# Altium footprint library myLib.PcbLib: 58 footprints (part 1 of 4)
Each footprint in its own frame and in the unit in brackets; x right, y up, seen from the top. Pads: shape width x height; smd on the part's side, far side on the other; paste and mask are expansions set on the pad; w line width, h text height; cw(c..) or ccw(c..) is an arc to the next point about the centre after c.
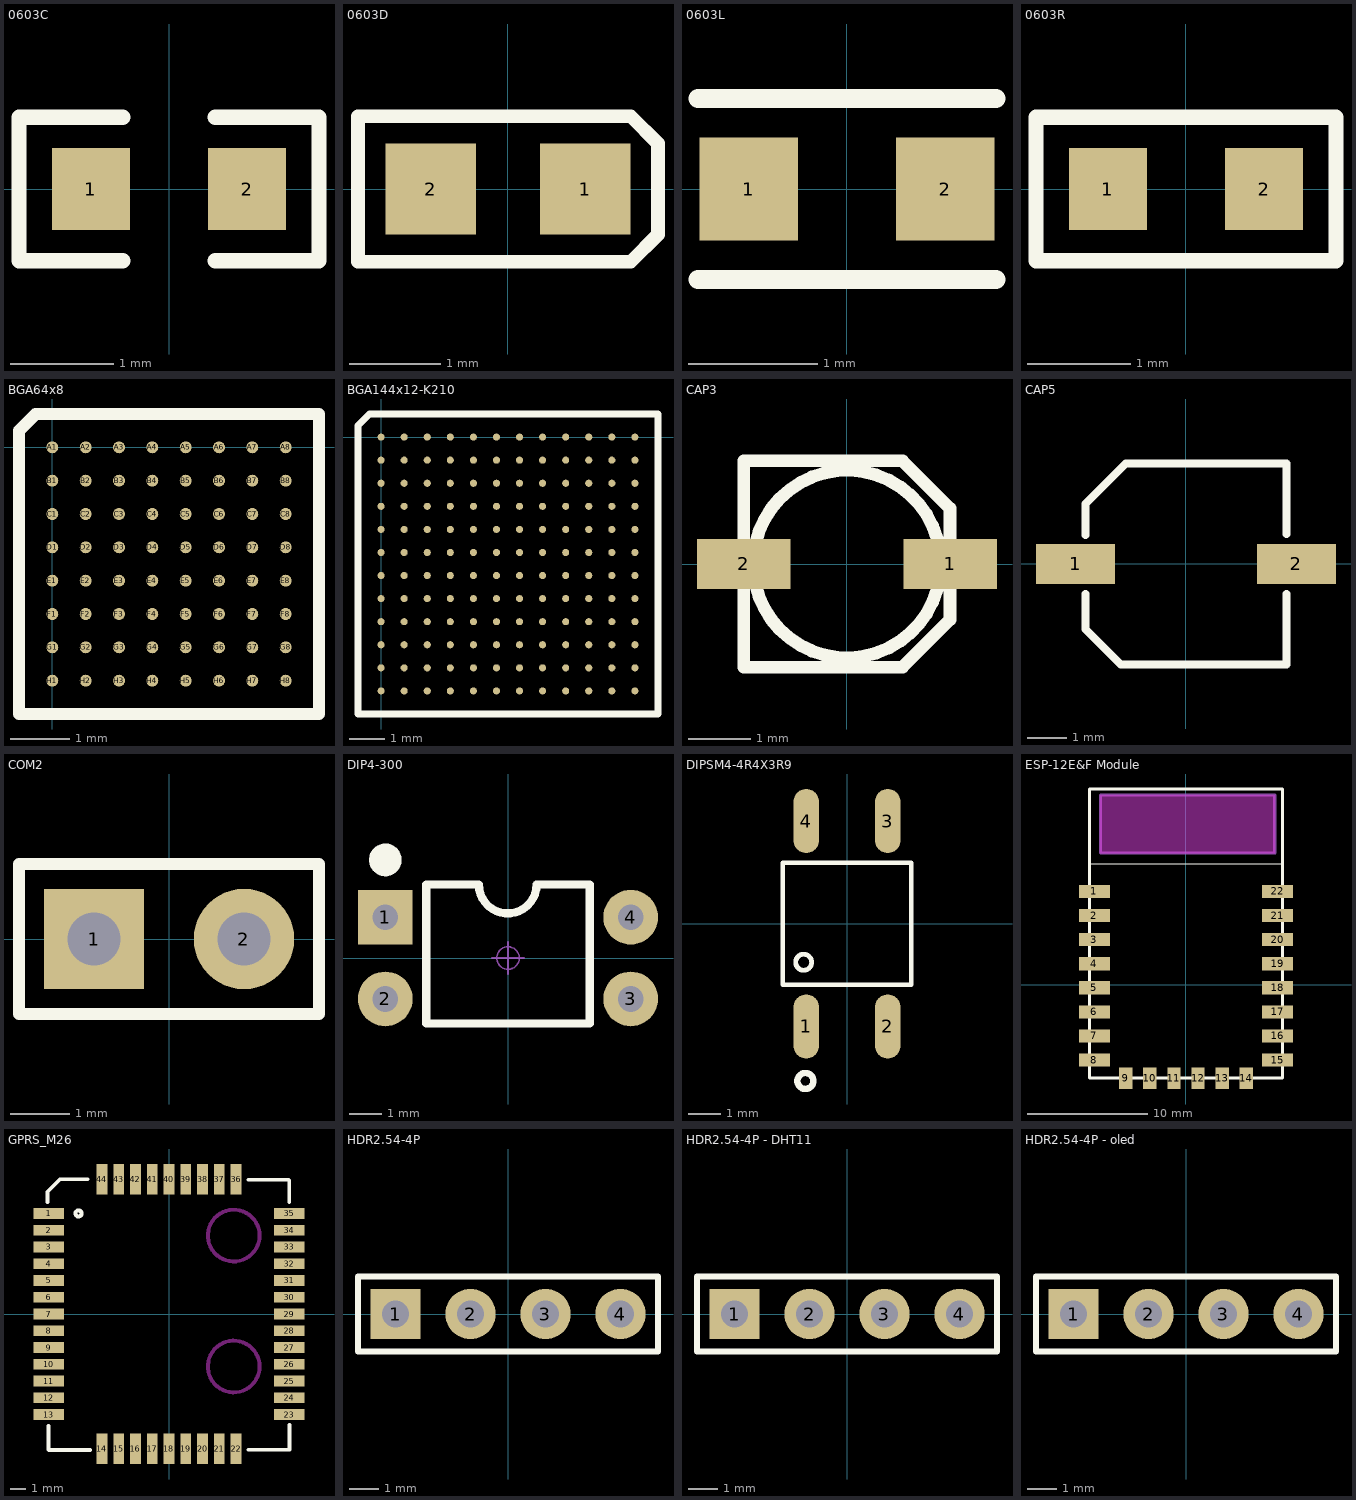
[diagram p0: the footprints below, top view; thin cyan lines are the x and y axes]

## 0603C [mm]
pads (2):
  rect 0.76x0.8 smd: 1(-0.76,0) 2(0.76,0)
Top Overlay:
  lines w0.15: -0.45,-0.7 -1.46,-0.7 -1.46,0.7 -0.45,0.7 ; 0.45,-0.7 1.46,-0.7 1.46,0.7 0.45,0.7
3D body "Capacitors_0603 (1608).STEP": height 0.85, standoff 0, extent -0.8,-0.4 0.801,0.4

## 0603D [mm]
pads (2):
  rect 1x1 smd: 1(0.85,0) 2(-0.85,0)
Top Overlay:
  lines w0.15: -1.65,-0.8 -1.65,0.8 1.35,0.8 1.65,0.5 1.65,-0.5 1.35,-0.8 -1.65,-0.8
3D body "ALSRobot-LED0603(R).STEP": height 0.6, standoff 0, extent -0.81,-0.4 0.81,0.4

## 0603L [mm]
pads (2):
  rect 0.76x0.8 smd: 1(-0.76,0) 2(0.76,0)
Top Overlay:
  lines w0.15: -1.15,-0.7 1.15,-0.7 ; -1.15,0.7 1.15,0.7

## 0603R [mm]
pads (2):
  rect 0.76x0.8 smd: 1(-0.76,0) 2(0.76,0)
Top Overlay:
  lines w0.15: -1.46,-0.7 -1.46,0.7 1.46,0.7 1.46,-0.7 -1.46,-0.7
3D body "RES-0603.STEP": height 0.56, standoff 0, extent -0.85,-0.4 0.85,0.4

## BGA64x8 [mm]
pads (64):
  round 0.2 smd: A1(0,0) A2(0.56,0) A3(1.12,0) A4(1.68,0) A5(2.24,0) A6(2.8,0) A7(3.36,0) A8(3.92,0) B1(0,-0.56) B2(0.56,-0.56) B3(1.12,-0.56) B4(1.68,-0.56) B5(2.24,-0.56) B6(2.8,-0.56) B7(3.36,-0.56) B8(3.92,-0.56) C1(0,-1.12) C2(0.56,-1.12) C3(1.12,-1.12) C4(1.68,-1.12) C5(2.24,-1.12) C6(2.8,-1.12) C7(3.36,-1.12) C8(3.92,-1.12) D1(0,-1.68) D2(0.56,-1.68) D3(1.12,-1.68) D4(1.68,-1.68) D5(2.24,-1.68) D6(2.8,-1.68) D7(3.36,-1.68) D8(3.92,-1.68) E1(0,-2.24) E2(0.56,-2.24) E3(1.12,-2.24) E4(1.68,-2.24) E5(2.24,-2.24) E6(2.8,-2.24) E7(3.36,-2.24) E8(3.92,-2.24) F1(0,-2.8) F2(0.56,-2.8) F3(1.12,-2.8) F4(1.68,-2.8) F5(2.24,-2.8) F6(2.8,-2.8) F7(3.36,-2.8) F8(3.92,-2.8) G1(0,-3.36) G2(0.56,-3.36) G3(1.12,-3.36) G4(1.68,-3.36) G5(2.24,-3.36) G6(2.8,-3.36) G7(3.36,-3.36) G8(3.92,-3.36) H1(0,-3.92) H2(0.56,-3.92) H3(1.12,-3.92) H4(1.68,-3.92) H5(2.24,-3.92) H6(2.8,-3.92) H7(3.36,-3.92) H8(3.92,-3.92)
Top Overlay:
  lines w0.2: -0.56,-4.48 -0.56,0.28 -0.28,0.56 4.48,0.56 4.48,-4.48 -0.56,-4.48

## BGA144x12-K210 [mm] "MCU k210"
pads (144):
  round 0.2 smd: A1(0,0) A2(0.65,0) A3(1.3,0) A4(1.95,0) A5(2.6,0) A6(3.25,0) A7(3.9,0) A8(4.55,0) A9(5.2,0) A10(5.85,0) A11(6.5,0) A12(7.15,0) B1(0,-0.65) B2(0.65,-0.65) B3(1.3,-0.65) B4(1.95,-0.65) B5(2.6,-0.65) B6(3.25,-0.65) B7(3.9,-0.65) B8(4.55,-0.65) B9(5.2,-0.65) B10(5.85,-0.65) B11(6.5,-0.65) B12(7.15,-0.65) C1(0,-1.3) C2(0.65,-1.3) C3(1.3,-1.3) C4(1.95,-1.3) C5(2.6,-1.3) C6(3.25,-1.3) C7(3.9,-1.3) C8(4.55,-1.3) C9(5.2,-1.3) C10(5.85,-1.3) C11(6.5,-1.3) C12(7.15,-1.3) D1(0,-1.95) D2(0.65,-1.95) D3(1.3,-1.95) D4(1.95,-1.95) D5(2.6,-1.95) D6(3.25,-1.95) D7(3.9,-1.95) D8(4.55,-1.95) D9(5.2,-1.95) D10(5.85,-1.95) D11(6.5,-1.95) D12(7.15,-1.95) E1(0,-2.6) E2(0.65,-2.6) E3(1.3,-2.6) E4(1.95,-2.6) E5(2.6,-2.6) E6(3.25,-2.6) E7(3.9,-2.6) E8(4.55,-2.6) E9(5.2,-2.6) E10(5.85,-2.6) E11(6.5,-2.6) E12(7.15,-2.6) F1(0,-3.25) F2(0.65,-3.25) F3(1.3,-3.25) F4(1.95,-3.25) F5(2.6,-3.25) F6(3.25,-3.25) F7(3.9,-3.25) F8(4.55,-3.25) F9(5.2,-3.25) F10(5.85,-3.25) F11(6.5,-3.25) F12(7.15,-3.25) G1(0,-3.9) G2(0.65,-3.9) G3(1.3,-3.9) G4(1.95,-3.9) G5(2.6,-3.9) G6(3.25,-3.9) G7(3.9,-3.9) G8(4.55,-3.9) G9(5.2,-3.9) G10(5.85,-3.9) G11(6.5,-3.9) G12(7.15,-3.9) H1(0,-4.55) H2(0.65,-4.55) H3(1.3,-4.55) H4(1.95,-4.55) H5(2.6,-4.55) H6(3.25,-4.55) H7(3.9,-4.55) H8(4.55,-4.55) H9(5.2,-4.55) H10(5.85,-4.55) H11(6.5,-4.55) H12(7.15,-4.55) J1(0,-5.2) J2(0.65,-5.2) J3(1.3,-5.2) J4(1.95,-5.2) J5(2.6,-5.2) J6(3.25,-5.2) J7(3.9,-5.2) J8(4.55,-5.2) J9(5.2,-5.2) J10(5.85,-5.2) J11(6.5,-5.2) J12(7.15,-5.2) K1(0,-5.85) K2(0.65,-5.85) K3(1.3,-5.85) K4(1.95,-5.85) K5(2.6,-5.85) K6(3.25,-5.85) K7(3.9,-5.85) K8(4.55,-5.85) K9(5.2,-5.85) K10(5.85,-5.85) K11(6.5,-5.85) K12(7.15,-5.85) L1(0,-6.5) L2(0.65,-6.5) L3(1.3,-6.5) L4(1.95,-6.5) L5(2.6,-6.5) L6(3.25,-6.5) L7(3.9,-6.5) L8(4.55,-6.5) L9(5.2,-6.5) L10(5.85,-6.5) L11(6.5,-6.5) L12(7.15,-6.5) M1(0,-7.15) M2(0.65,-7.15) M3(1.3,-7.15) M4(1.95,-7.15) M5(2.6,-7.15) M6(3.25,-7.15) M7(3.9,-7.15) M8(4.55,-7.15) M9(5.2,-7.15) M10(5.85,-7.15) M11(6.5,-7.15) M12(7.15,-7.15)
Top Overlay:
  lines w0.2: -0.65,-7.8 7.8,-7.8 7.8,0.65 -0.325,0.65 -0.65,0.325 -0.65,-7.8

## CAP3 [mm] "直径3mm（蒜米工坊）"
height 5.4
pads (2):
  rect 1.5x0.8 smd: 1(1.651,0) 2(-1.65,0)
Top Overlay:
  circle w0.203: c0,0 r1.5
  lines w0.203: -1.65,-1.65 0.89,-1.65 1.65,-0.89 1.65,0.89 0.89,1.65 -1.65,1.65 -1.65,-1.65
3D body "CM A(3X5.4).STEP": height 5.4, standoff -0.01, extent -1.9,-1.65 1.9,1.65

## CAP5 [mm] "直径5mm（蒜米工坊）"
pads (2):
  rect 2x1 smd: 1(-2.794,0) 2(2.794,0)
Top Overlay:
  lines w0.2: -2.54,-0.762 -2.54,-1.651 -1.651,-2.54 2.54,-2.54 2.54,-0.762 ; -2.54,0.73 -2.54,1.524 -1.524,2.54 2.54,2.54 2.54,0.762
3D body "SL-B.STEP": height 5.2, standoff 0, extent -2.274,-2.15 2.326,2.15

## COM2 [mm] "排针，2脚"
pads (2):
  rect 1.7x1.7 hole 0.9: 1(-1.27,0)
  round 1.7 hole 0.9: 2(1.27,0)
Top Overlay:
  lines w0.2: -2.54,-1.27 2.54,-1.27 2.54,1.27 -2.54,1.27 -2.54,-1.27

## DIP4-300 [mm] "4.6*7.6*3.8(长宽高）"
pads (4):
  rect 1.7x1.7 hole 0.8: 1(-3.81,1.27)
  round 1.7 hole 0.8: 2(-3.81,-1.27) 3(3.81,-1.27) 4(3.81,1.27)
Top Overlay:
  circle w0.508: c-3.81,3.048 r0.254
  lines w0.254: -2.54,-2.032 -2.54,2.286 -0.907,2.286 ccw(c-0.009,2.286) 0.889,2.286 2.54,2.286 2.54,-2.032 -2.54,-2.032
Mechanical 15:
  circle w0.05: c0,0 r0.35
  lines w0.05: -0.5,0 0.5,0 ; 0,-0.5 0,0.5
3D body "DIP4-300.STEP": height 4.5, standoff -3.29, extent -3.935,-2.29 3.935,2.29

## DIPSM4-4R4X3R9 [mm]
pads (4):
  oval 0.8x2 smd: 1(-1.27,-3.2) 2(1.27,-3.2) 3(1.27,3.2) 4(-1.27,3.2)
Top Overlay:
  circle w0.2: c-1.295,-4.9 r0.25
  circle w0.15: c-1.35,-1.2 r0.25
  lines w0.15: -2,-1.9 -2,1.9 2,1.9 2,-1.9 -2,-1.9

## ESP-12E&F Module [mm]
pads (22):
  rect 2.6x1.1 smd: 1(-7.6,7.75) 2(-7.6,5.75) 3(-7.6,3.75) 4(-7.6,1.75) 5(-7.6,-0.25) 6(-7.6,-2.25) 7(-7.6,-4.25) 8(-7.6,-6.25) 15(7.6,-6.25) 16(7.6,-4.25) 17(7.6,-2.25) 18(7.6,-0.25) 19(7.6,1.75) 20(7.6,3.75) 21(7.6,5.75) 22(7.6,7.75)
  rect 1.1x1.8 smd: 9(-5,-7.75) 10(-3,-7.75) 11(-1,-7.75) 12(1,-7.75) 13(3,-7.75) 14(5,-7.75)
Top Overlay:
  lines w0.1: -8,10.05 8,10.05
  lines w0.254: -8,-7.75 -8,16.25 8,16.25 8,-7.75 -8,-7.75
Keep-Out Layer:
  board cut-out: -7.112,15.748 7.366,15.748 7.366,10.922 -7.112,10.922
Mechanical 13:
  lines w0.254: 7.366,10.922 -7.112,10.922 -7.112,15.748 7.366,15.748 ; 7.366,10.922 7.366,10.922 ; 7.366,10.922 7.366,15.748 ; 7.366,15.748 7.366,15.748
3D body: height 0.4, standoff -0.4, extent 0,-0.127 0,-0.127
3D body "User Library-ESP8266-12E.STEP": height 3.1, standoff 0.1, extent -8,-7.745 8,16.635

## GPRS_M26 [mm]
pads (44):
  rect 2x0.7 smd: 1(-7.9,6.6) 2(-7.9,5.5) 3(-7.9,4.4) 4(-7.9,3.3) 5(-7.9,2.2) 6(-7.9,1.1) 7(-7.9,0) 8(-7.9,-1.1) 9(-7.9,-2.2) 10(-7.9,-3.3) 11(-7.9,-4.4) 12(-7.9,-5.5) 13(-7.9,-6.6) 23(7.9,-6.6) 24(7.9,-5.5) 25(7.9,-4.4) 26(7.9,-3.3) 27(7.9,-2.2) 28(7.9,-1.1) 29(7.9,0) 30(7.9,1.1) 31(7.9,2.2) 32(7.9,3.3) 33(7.9,4.4) 34(7.9,5.5) 35(7.9,6.6)
  rect 0.7x2 smd: 14(-4.4,-8.85) 15(-3.3,-8.85) 16(-2.2,-8.85) 17(-1.1,-8.85) 18(0,-8.85) 19(1.1,-8.85) 20(2.2,-8.85) 21(3.3,-8.85) 22(4.4,-8.85) 36(4.4,8.85) 37(3.3,8.85) 38(2.2,8.85) 39(1.1,8.85) 40(0,8.85) 41(-1.1,8.85) 42(-2.2,8.85) 43(-3.3,8.85) 44(-4.4,8.85)
Top Overlay:
  circle w0.254: c-5.944,6.604 r0.198
  lines w0.254: -7.976,7.366 -7.976,8.026 -7.152,8.85 -5.359,8.85 ; -7.925,-7.366 -7.925,-8.915 -7.899,-8.941 -5.182,-8.941 ; 5.207,8.814 7.849,8.814 7.899,8.763 7.899,7.366 ; 5.232,-8.915 7.925,-8.915 7.925,-7.29
Keep-Out Layer:
  circle w0.254: c4.25,-3.45 r1.7
  circle w0.254: c4.25,5.15 r1.7

## HDR2.54-4P [mm] "4脚"
pads (4):
  rect 1.7x1.7 hole 0.9: 1(-3.81,0)
  round 1.7 hole 0.9: 2(-1.27,0) 3(1.27,0) 4(3.81,0)
Top Overlay:
  lines w0.2: -5.08,-1.27 5.08,-1.27 5.08,1.27 -5.08,1.27 -5.08,-1.27

## HDR2.54-4P - DHT11 [mm] "4脚"
pads (4):
  rect 1.7x1.7 hole 0.9: 1(-3.81,0)
  round 1.7 hole 0.9: 2(-1.27,0) 3(1.27,0) 4(3.81,0)
Top Overlay:
  lines w0.2: -5.08,-1.27 -5.08,1.27 5.08,1.27 5.08,-1.27 -5.08,-1.27
3D body "DHT11.STEP": height 5.5, standoff 0, extent -5.873,-5.336 6.127,18.164

## HDR2.54-4P - oled [mm] "4脚"
pads (4):
  rect 1.7x1.7 hole 0.9: 1(-3.81,0)
  round 1.7 hole 0.9: 2(-1.27,0) 3(1.27,0) 4(3.81,0)
Top Overlay:
  lines w0.2: -5.08,-1.27 -5.08,1.27 5.08,1.27 5.08,-1.27 -5.08,-1.27
3D body "128x64I2COLEDDisplay.STEP": height 6.97, standoff -3.87, extent -13.365,-25.614 13.335,2.246